# Altium footprint library ICs And Semiconductors THD.PcbLib: 292 footprints (part 11 of 19)
Each footprint in its own frame and in the unit in brackets; x right, y up, seen from the top. Pads: shape width x height; smd on the part's side, far side on the other; paste and mask are expansions set on the pad; w line width, h text height; cw(c..) or ccw(c..) is an arc to the next point about the centre after c.
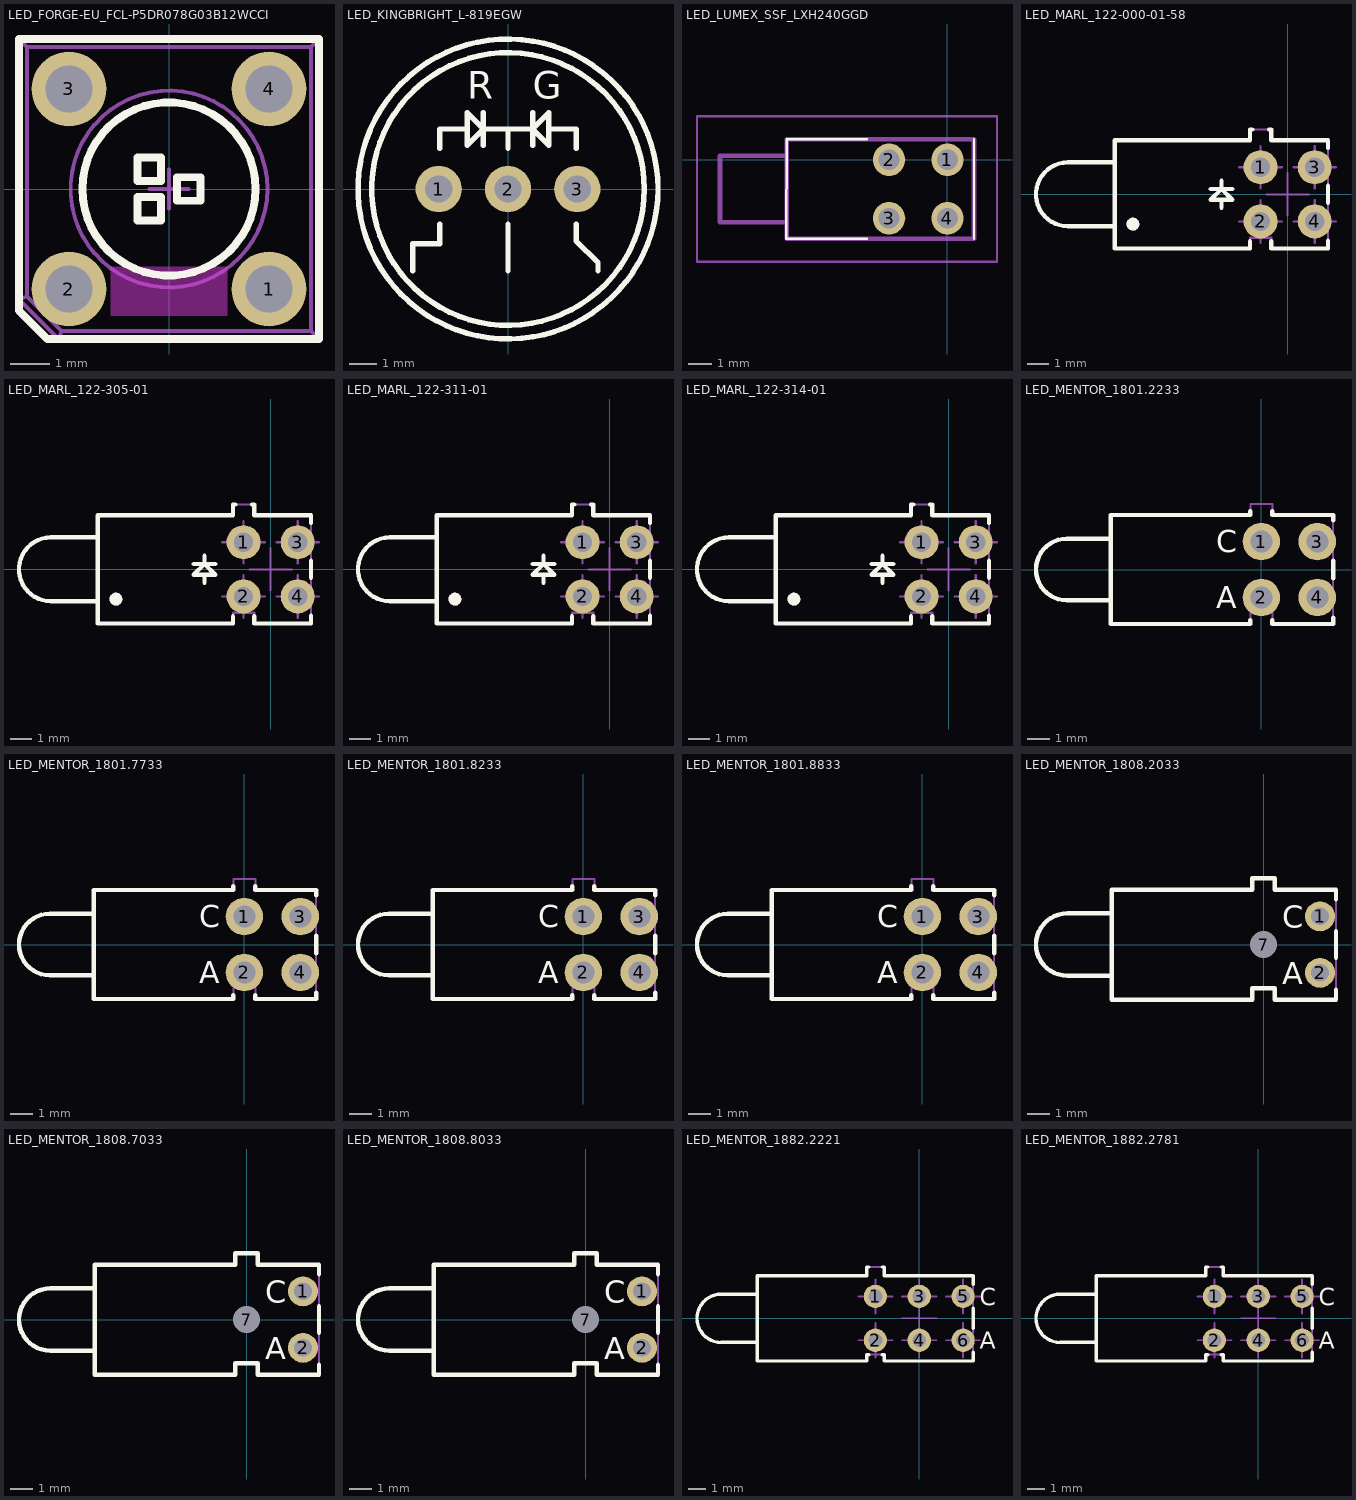
[diagram p10: the footprints below, top view; thin cyan lines are the x and y axes]

## LED_FORGE-EU_FCL-P5DR078G03B12WCCI [mm] "7.6mm Square Domed Tricolor (RGB) Through Hole LED Lamp"
height 7.4
pads (4):
  round 1.9 hole 1.2: 1(2.54,-2.54) 2(-2.54,-2.54) 3(-2.54,2.54) 4(2.54,2.54)
Top Layer keep-out:
  region: -1.475,-1.975 1.475,-1.975 1.475,-3.225 -1.475,-3.225
Top Overlay:
  circle w0.2: c0,0 r2.2
  lines w0.2: -3.81,-3.09 -3.81,3.81 3.81,3.81 3.81,-3.81 -3.09,-3.81 -3.81,-3.09 ; -0.8,-0.8 -0.2,-0.8 -0.2,-0.2 -0.8,-0.2 -0.8,-0.8 ; -0.8,0.2 -0.2,0.2 -0.2,0.8 -0.8,0.8 -0.8,0.2 ; 0.2,-0.3 0.8,-0.3 0.8,0.3 0.2,0.3 0.2,-0.3
Notvisible:
  lines w0.1: -3.04,-2.54 -2.54,-2.54 ; -3.04,2.54 -2.54,2.54 ; -2.54,-3.04 -2.54,-2.54 ; -2.54,-2.04 -2.54,-2.54 ; -2.54,2.04 -2.54,2.54 ; -2.54,3.04 -2.54,2.54 ; -2.04,-2.54 -2.54,-2.54 ; -2.04,2.54 -2.54,2.54 ; -0.5,0 0,0 ; 0,-0.5 0,0 ; 0,0.5 0,0 ; 0.5,0 0,0 ; 2.04,-2.54 2.54,-2.54 ; 2.04,2.54 2.54,2.54 ; 2.54,-3.04 2.54,-2.54 ; 2.54,-2.04 2.54,-2.54 ; 2.54,2.04 2.54,2.54 ; 2.54,3.04 2.54,2.54 ; 3.04,-2.54 2.54,-2.54 ; 3.04,2.54 2.54,2.54
Mechanical 14:
  circle w0.1: c0,0 r2.5
  lines w0.1: -3.81,-2.81 -3.61,-2.727 ; -3.81,-2.81 -3.81,3.81 ; -3.81,-2.81 -2.81,-3.81 ; -3.81,3.81 -3.61,3.61 ; -3.81,3.81 3.81,3.81 ; -3.61,-2.727 -3.61,3.61 ; -3.61,-2.727 -2.727,-3.61 ; -3.61,3.61 3.61,3.61 ; -2.81,-3.81 -2.727,-3.61 ; -2.81,-3.81 3.81,-3.81 ; -2.727,-3.61 3.61,-3.61 ; 3.61,-3.61 3.81,-3.81 ; 3.61,-3.61 3.61,3.61 ; 3.61,3.61 3.81,3.81 ; 3.81,-3.81 3.81,3.81 ; -0.8,-0.8 -0.2,-0.8 -0.2,-0.2 -0.8,-0.2 -0.8,-0.8 ; -0.8,0.2 -0.2,0.2 -0.2,0.8 -0.8,0.8 -0.8,0.2 ; 0.2,-0.3 0.8,-0.3 0.8,0.3 0.2,0.3 0.2,-0.3
3D body "LED_FORGE-EU_FCL-P5DR078G03B12WCCI.stp": height 7.4, standoff -3.6, extent -3.81,-3.81 3.81,3.81

## LED_KINGBRIGHT_L-819EGW [mm] "10mm Diameter, Bicolor Red/Green LED Lamp"
height 18.2
pads (3):
  round 1.7 hole 1: 1(-2.54,0) 2(0,0) 3(2.54,0)
Top Overlay:
  circle w0.2: c0,0 r5
  circle w0.2: c0,0 r5.5
  lines w0.2: -3.5,-3 -3.5,-2 -2.5,-2 -2.5,-1.3 ; -2.5,1.5 -2.5,2.2 -1.5,2.2 ; -0.9,1.6 -0.9,2.8 ; 0,-3 0,-1.3 ; 0,1.5 0,2.2 ; 0.9,1.6 0.9,2.8 ; 1.5,2.2 2.5,2.2 2.5,1.5 ; 2.5,-1.9 3.3,-2.7 3.3,-3 ; 2.5,-1.85 2.5,-1.3 ; -0.9,2.2 0,2.2 ; -0.9,2.2 -1.5,1.6 -1.5,2.8 -0.9,2.2 ; 0,2.2 0.9,2.2 ; 0.9,2.2 1.5,1.6 1.5,2.8 0.9,2.2
  text "G" at 0.9,3.3 h1
  text "R" at -1.5,3.3 h1
Mechanical 14:
  circle w0.1: c0,0 r5.5
  circle w0.1: c0,0 r5
  lines w0.1: -3.5,-3 -3.5,-2 -2.5,-2 -2.5,-1.3 ; -2.5,1.5 -2.5,2.2 -1.5,2.2 ; -0.9,1.6 -0.9,2.8 ; 0,-3 0,-1.3 ; 0,1.5 0,2.2 ; 0.9,1.6 0.9,2.8 ; 1.5,2.2 2.5,2.2 2.5,1.5 ; 2.5,-1.9 3.3,-2.7 3.3,-3 ; 2.5,-1.85 2.5,-1.3 ; -0.9,2.2 0,2.2 ; -0.9,2.2 -1.5,2.8 -1.5,1.6 -0.9,2.2 ; 0,2.2 0.9,2.2 ; 0.9,2.2 1.5,2.8 1.5,1.6 0.9,2.2
  text "R" at -1.5,3.3 h1
  text "G" at 0.9,3.3 h1
3D body "LED_KINGBRIGHT_L-819EGW.stp": height 18.2, standoff -3.8, extent -5.5,-5.5 5.5,5.5

## LED_LUMEX_SSF_LXH240GGD [mm]
pads (4):
  round 1.411 hole 0.91: 1(0,0) 2(-2.54,0) 3(-2.54,-2.54) 4(0,-2.54)
Top Overlay:
  lines w0.1: -3.5,-3.43 -7,-3.43 -6.98,0.89 -3.5,0.89 ; 1.15,-3.43 1.15,0.89
Mechanical 15:
  lines w0.2: -9.88,-2.72 -6.98,-2.72 -6.98,0.18 -9.88,0.18 -9.88,-2.72 ; -6.98,-3.43 -6.98,0.89 1.15,0.89 1.15,-3.43 -6.98,-3.43
Mechanical 20:
  lines w0.1: -10.88,-4.43 -10.88,1.89 2.15,1.89 2.15,-4.43 -10.88,-4.43
3D body "SSF-LXH240YGD.stp": height 9.75, standoff -5, extent -9.88,-3.43 1.15,0.89

## LED_MARL_122-000-01-58 [mm] "2x 3mm LED (Top: Red, Bot: Green) Body 10x5.08mm, Pin spacing 2.54mm"
height 10.16
pads (4):
  round 1.6 hole 0.9: 1(-1.27,1.27) 2(-1.27,-1.27) 3(1.27,1.27) 4(1.27,-1.27)
Top Overlay:
  circle w0.3: c-7.262,-1.397 r0.15
  lines w0.2: -8.11,-1.5 -10.31,-1.5 cw(c-10.31,0) -10.31,1.5 -8.11,1.5 ; -3.614,0.254 -2.598,0.254 ; -3.106,-0.635 -3.106,-0.254 ; -3.106,0.635 -3.106,0.254 ; -1.77,-2.2 -1.77,-2.54 -8.11,-2.54 -8.11,2.54 -1.77,2.54 -1.77,3.04 -1.66,3.04 ; -0.88,3.04 -0.77,3.04 -0.77,2.54 1.89,2.54 1.89,2.175 ; -0.77,-2.2 -0.77,-2.54 1.89,-2.54 1.89,-2.175 ; 1.89,-0.4 1.89,0.4 ; -3.106,0.254 -3.614,-0.254 -2.598,-0.254 -3.106,0.254
Notvisible:
  lines w0.1: -2.27,-1.27 -1.27,-1.27 ; -2.27,1.27 -1.27,1.27 ; -1.27,-2.27 -1.27,-1.27 ; -1.27,-0.27 -1.27,-1.27 ; -1.27,0.27 -1.27,1.27 ; -1.27,2.27 -1.27,1.27 ; -1,0 0,0 ; -0.27,-1.27 -1.27,-1.27 ; -0.27,1.27 -1.27,1.27 ; 0,-1 0,0 ; 0,1 0,0 ; 0.27,-1.27 1.27,-1.27 ; 0.27,1.27 1.27,1.27 ; 1,0 0,0 ; 1.27,-2.27 1.27,-1.27 ; 1.27,-0.27 1.27,-1.27 ; 1.27,0.27 1.27,1.27 ; 1.27,2.27 1.27,1.27 ; 2.27,-1.27 1.27,-1.27 ; 2.27,1.27 1.27,1.27
Mechanical 14:
  circle w0.3: c-7.262,-1.397 r0.15
  lines w0.1: -8.11,-1.5 -10.31,-1.5 cw(c-10.31,0) -10.31,1.5 -8.11,1.5 ; -3.106,-0.635 -3.106,-0.254 ; -3.106,0.635 -3.106,0.254 ; -3.614,-0.254 -2.598,-0.254 ; -3.614,-0.254 -3.106,0.254 ; -3.614,-0.254 -3.106,0.254 ; -3.614,-0.254 -2.598,-0.254 ; -3.614,-0.254 -2.598,-0.254 ; -3.614,-0.254 -3.106,0.254 ; -3.614,0.254 -2.598,0.254 ; -3.614,0.254 -2.598,0.254 ; -3.614,0.254 -2.598,0.254 ; -3.106,0.254 -2.598,-0.254 ; -3.106,0.254 -2.598,-0.254 ; -3.106,0.254 -2.598,-0.254 ; -8.11,-2.54 -8.11,2.54 -1.77,2.54 -1.77,3.04 -0.77,3.04 -0.77,2.54 1.89,2.54 1.89,-2.54 -0.77,-2.54 -0.77,-2.04 -1.77,-2.04 -1.77,-2.54 -8.11,-2.54
3D body "LED_MARL_122-000-01-58.stp": height 10.16, standoff -3.75, extent -11.81,-2.54 1.89,3.04

## LED_MARL_122-305-01 [mm] "Dual 3mm Red LED, Body 10x5.08mm, Pin spacing 2.54mm"
height 10.16
pads (4):
  round 1.6 hole 0.9: 1(-1.27,1.27) 2(-1.27,-1.27) 3(1.27,1.27) 4(1.27,-1.27)
Top Overlay:
  circle w0.3: c-7.262,-1.397 r0.15
  lines w0.2: -8.11,-1.5 -10.31,-1.5 cw(c-10.31,0) -10.31,1.5 -8.11,1.5 ; -3.614,0.254 -2.598,0.254 ; -3.106,-0.635 -3.106,-0.254 ; -3.106,0.635 -3.106,0.254 ; -1.77,-2.2 -1.77,-2.54 -8.11,-2.54 -8.11,2.54 -1.77,2.54 -1.77,3.04 -1.66,3.04 ; -0.88,3.04 -0.77,3.04 -0.77,2.54 1.89,2.54 1.89,2.175 ; -0.77,-2.2 -0.77,-2.54 1.89,-2.54 1.89,-2.175 ; 1.89,-0.4 1.89,0.4 ; -3.106,0.254 -3.614,-0.254 -2.598,-0.254 -3.106,0.254
Notvisible:
  lines w0.1: -2.27,-1.27 -1.27,-1.27 ; -2.27,1.27 -1.27,1.27 ; -1.27,-2.27 -1.27,-1.27 ; -1.27,-0.27 -1.27,-1.27 ; -1.27,0.27 -1.27,1.27 ; -1.27,2.27 -1.27,1.27 ; -1,0 0,0 ; -0.27,-1.27 -1.27,-1.27 ; -0.27,1.27 -1.27,1.27 ; 0,-1 0,0 ; 0,1 0,0 ; 0.27,-1.27 1.27,-1.27 ; 0.27,1.27 1.27,1.27 ; 1,0 0,0 ; 1.27,-2.27 1.27,-1.27 ; 1.27,-0.27 1.27,-1.27 ; 1.27,0.27 1.27,1.27 ; 1.27,2.27 1.27,1.27 ; 2.27,-1.27 1.27,-1.27 ; 2.27,1.27 1.27,1.27
Mechanical 14:
  circle w0.3: c-7.262,-1.397 r0.15
  lines w0.1: -8.11,-1.5 -10.31,-1.5 cw(c-10.31,0) -10.31,1.5 -8.11,1.5 ; -3.106,-0.635 -3.106,-0.254 ; -3.106,0.635 -3.106,0.254 ; -3.614,-0.254 -2.598,-0.254 ; -3.614,-0.254 -3.106,0.254 ; -3.614,-0.254 -3.106,0.254 ; -3.614,-0.254 -2.598,-0.254 ; -3.614,-0.254 -2.598,-0.254 ; -3.614,-0.254 -3.106,0.254 ; -3.614,0.254 -2.598,0.254 ; -3.614,0.254 -2.598,0.254 ; -3.614,0.254 -2.598,0.254 ; -3.106,0.254 -2.598,-0.254 ; -3.106,0.254 -2.598,-0.254 ; -3.106,0.254 -2.598,-0.254 ; -8.11,-2.54 -1.77,-2.54 -1.77,-2.04 -0.77,-2.04 -0.77,-2.54 1.89,-2.54 1.89,2.54 -0.77,2.54 -0.77,3.04 -1.77,3.04 -1.77,2.54 -8.11,2.54 -8.11,-2.54
3D body "LED_MARL_122-305-01.stp": height 10.16, standoff -3.75, extent -11.81,-2.54 1.89,3.04

## LED_MARL_122-311-01 [mm] "Dual 3mm Yellow LED, Body 10x5.08mm, Pin spacing 2.54mm"
height 10.16
pads (4):
  round 1.6 hole 0.9: 1(-1.27,1.27) 2(-1.27,-1.27) 3(1.27,1.27) 4(1.27,-1.27)
Top Overlay:
  circle w0.3: c-7.262,-1.397 r0.15
  lines w0.2: -8.11,-1.5 -10.31,-1.5 cw(c-10.31,0) -10.31,1.5 -8.11,1.5 ; -3.614,0.254 -2.598,0.254 ; -3.106,-0.635 -3.106,-0.254 ; -3.106,0.635 -3.106,0.254 ; -1.77,-2.2 -1.77,-2.54 -8.11,-2.54 -8.11,2.54 -1.77,2.54 -1.77,3.04 -1.66,3.04 ; -0.88,3.04 -0.77,3.04 -0.77,2.54 1.89,2.54 1.89,2.175 ; -0.77,-2.2 -0.77,-2.54 1.89,-2.54 1.89,-2.175 ; 1.89,-0.4 1.89,0.4 ; -3.106,0.254 -3.614,-0.254 -2.598,-0.254 -3.106,0.254
Notvisible:
  lines w0.1: -2.27,-1.27 -1.27,-1.27 ; -2.27,1.27 -1.27,1.27 ; -1.27,-2.27 -1.27,-1.27 ; -1.27,-0.27 -1.27,-1.27 ; -1.27,0.27 -1.27,1.27 ; -1.27,2.27 -1.27,1.27 ; -1,0 0,0 ; -0.27,-1.27 -1.27,-1.27 ; -0.27,1.27 -1.27,1.27 ; 0,-1 0,0 ; 0,1 0,0 ; 0.27,-1.27 1.27,-1.27 ; 0.27,1.27 1.27,1.27 ; 1,0 0,0 ; 1.27,-2.27 1.27,-1.27 ; 1.27,-0.27 1.27,-1.27 ; 1.27,0.27 1.27,1.27 ; 1.27,2.27 1.27,1.27 ; 2.27,-1.27 1.27,-1.27 ; 2.27,1.27 1.27,1.27
Mechanical 14:
  circle w0.3: c-7.262,-1.397 r0.15
  lines w0.1: -8.11,-1.5 -10.31,-1.5 cw(c-10.31,0) -10.31,1.5 -8.11,1.5 ; -3.106,-0.635 -3.106,-0.254 ; -3.106,0.635 -3.106,0.254 ; -3.614,-0.254 -2.598,-0.254 ; -3.614,-0.254 -3.106,0.254 ; -3.614,-0.254 -3.106,0.254 ; -3.614,-0.254 -2.598,-0.254 ; -3.614,-0.254 -2.598,-0.254 ; -3.614,-0.254 -3.106,0.254 ; -3.614,0.254 -2.598,0.254 ; -3.614,0.254 -2.598,0.254 ; -3.614,0.254 -2.598,0.254 ; -3.106,0.254 -2.598,-0.254 ; -3.106,0.254 -2.598,-0.254 ; -3.106,0.254 -2.598,-0.254 ; -8.11,-2.54 -8.11,2.54 -1.77,2.54 -1.77,3.04 -0.77,3.04 -0.77,2.54 1.89,2.54 1.89,-2.54 -0.77,-2.54 -0.77,-2.04 -1.77,-2.04 -1.77,-2.54 -8.11,-2.54
3D body "LED_MARL_122-311-01.stp": height 10.16, standoff -3.75, extent -11.81,-2.54 1.89,3.04

## LED_MARL_122-314-01 [mm] "Dual 3mm Green LED, Body 10x5.08mm, Pin spacing 2.54mm"
height 10.16
pads (4):
  round 1.6 hole 0.9: 1(-1.27,1.27) 2(-1.27,-1.27) 3(1.27,1.27) 4(1.27,-1.27)
Top Overlay:
  circle w0.3: c-7.262,-1.397 r0.15
  lines w0.2: -8.11,-1.5 -10.31,-1.5 cw(c-10.31,0) -10.31,1.5 -8.11,1.5 ; -3.614,0.254 -2.598,0.254 ; -3.106,-0.635 -3.106,-0.254 ; -3.106,0.635 -3.106,0.254 ; -1.77,-2.2 -1.77,-2.54 -8.11,-2.54 -8.11,2.54 -1.77,2.54 -1.77,3.04 -1.66,3.04 ; -0.88,3.04 -0.77,3.04 -0.77,2.54 1.89,2.54 1.89,2.175 ; -0.77,-2.2 -0.77,-2.54 1.89,-2.54 1.89,-2.175 ; 1.89,-0.4 1.89,0.4 ; -3.106,0.254 -2.598,-0.254 -3.614,-0.254 -3.106,0.254
Notvisible:
  lines w0.1: -2.27,-1.27 -1.27,-1.27 ; -2.27,1.27 -1.27,1.27 ; -1.27,-2.27 -1.27,-1.27 ; -1.27,-0.27 -1.27,-1.27 ; -1.27,0.27 -1.27,1.27 ; -1.27,2.27 -1.27,1.27 ; -1,0 0,0 ; -0.27,-1.27 -1.27,-1.27 ; -0.27,1.27 -1.27,1.27 ; 0,-1 0,0 ; 0,1 0,0 ; 0.27,-1.27 1.27,-1.27 ; 0.27,1.27 1.27,1.27 ; 1,0 0,0 ; 1.27,-2.27 1.27,-1.27 ; 1.27,-0.27 1.27,-1.27 ; 1.27,0.27 1.27,1.27 ; 1.27,2.27 1.27,1.27 ; 2.27,-1.27 1.27,-1.27 ; 2.27,1.27 1.27,1.27
Mechanical 14:
  circle w0.3: c-7.262,-1.397 r0.15
  lines w0.1: -8.11,-1.5 -10.31,-1.5 cw(c-10.31,0) -10.31,1.5 -8.11,1.5 ; -3.106,-0.635 -3.106,-0.254 ; -3.106,0.635 -3.106,0.254 ; -3.614,-0.254 -3.106,0.254 ; -3.614,-0.254 -2.598,-0.254 ; -3.614,-0.254 -2.598,-0.254 ; -3.614,-0.254 -3.106,0.254 ; -3.614,-0.254 -3.106,0.254 ; -3.614,-0.254 -2.598,-0.254 ; -3.614,0.254 -2.598,0.254 ; -3.614,0.254 -2.598,0.254 ; -3.614,0.254 -2.598,0.254 ; -3.106,0.254 -2.598,-0.254 ; -3.106,0.254 -2.598,-0.254 ; -3.106,0.254 -2.598,-0.254 ; -8.11,-2.54 -8.11,2.54 -1.77,2.54 -1.77,3.04 -0.77,3.04 -0.77,2.54 1.89,2.54 1.89,-2.54 -0.77,-2.54 -0.77,-2.04 -1.77,-2.04 -1.77,-2.54 -8.11,-2.54
3D body "LED_MARL_122-314-01.stp": height 10.16, standoff -3.75, extent -11.81,-2.54 1.89,3.04

## LED_MENTOR_1801.2233 [mm] "2 x LED 3mm  (Top: HEF Red, Bot: HEF Red) PCB Edge Mounting MENTOR 1801.2233"
height 10
pads (4):
  round 1.7 hole 1: 1(0,1.27) 2(0,-1.27) 3(2.54,1.27) 4(2.54,-1.27)
Top Overlay:
  lines w0.2: -6.84,-1.4 -8.84,-1.4 cw(c-8.84,0) -8.84,1.4 -6.84,1.4 ; -0.5,-2.3 -0.5,-2.475 -6.84,-2.475 -6.84,2.475 -0.5,2.475 -0.5,2.65 ; 0.5,-2.3 0.5,-2.475 3.26,-2.475 3.26,-2.2 ; 0.5,2.65 0.5,2.475 3.26,2.475 3.26,2.24 ; 3.26,-0.4 3.26,0.4
  text "A" at -2.062,-1.753 h1
  text "C" at -2.062,0.787 h1
Mechanical 14:
  lines w0.1: -6.84,-1.4 -8.84,-1.4 cw(c-8.84,0) -8.84,1.4 -6.84,1.4 ; -6.84,-2.475 -6.84,2.475 -0.5,2.475 -0.5,2.975 0.5,2.975 0.5,2.475 3.26,2.475 3.26,-2.475 0.5,-2.475 0.5,-1.975 -0.5,-1.975 -0.5,-2.475 -6.84,-2.475
  text "C" at -2.062,0.787 h1
  text "A" at -2.062,-1.753 h1
3D body "LED_MENTOR_1801.2233.stp": height 10, standoff -3.2, extent -10.24,-2.475 3.246,2.975

## LED_MENTOR_1801.7733 [mm] "2 x LED 3mm  (Top: Yellow, Bot: Yellow) PCB Edge Mounting MENTOR 1801.7733"
height 10
pads (4):
  round 1.7 hole 1: 1(0,1.27) 2(0,-1.27) 3(2.54,1.27) 4(2.54,-1.27)
Top Overlay:
  lines w0.2: -6.84,-1.4 -8.84,-1.4 cw(c-8.84,0) -8.84,1.4 -6.84,1.4 ; -0.5,-2.3 -0.5,-2.475 -6.84,-2.475 -6.84,2.475 -0.5,2.475 -0.5,2.65 ; 0.5,-2.3 0.5,-2.475 3.26,-2.475 3.26,-2.2 ; 0.5,2.65 0.5,2.475 3.26,2.475 3.26,2.24 ; 3.26,-0.4 3.26,0.4
  text "C" at -2.062,0.787 h1
  text "A" at -2.062,-1.753 h1
Mechanical 14:
  lines w0.1: -6.84,-1.4 -8.84,-1.4 cw(c-8.84,0) -8.84,1.4 -6.84,1.4 ; -6.84,-2.475 -0.5,-2.475 -0.5,-1.975 0.5,-1.975 0.5,-2.475 3.26,-2.475 3.26,2.475 0.5,2.475 0.5,2.975 -0.5,2.975 -0.5,2.475 -6.84,2.475 -6.84,-2.475
  text "A" at -2.062,-1.753 h1
  text "C" at -2.062,0.787 h1
3D body "LED_MENTOR_1801.7733.stp": height 10, standoff -3.2, extent -10.225,-2.475 3.26,2.975

## LED_MENTOR_1801.8233 [mm] "2 x LED 3mm  (Top: Red, Bot: Green) PCB Edge Mounting MENTOR 1801.8233"
height 10
pads (4):
  round 1.7 hole 1: 1(0,1.27) 2(0,-1.27) 3(2.54,1.27) 4(2.54,-1.27)
Top Overlay:
  lines w0.2: -6.84,-1.4 -8.84,-1.4 cw(c-8.84,0) -8.84,1.4 -6.84,1.4 ; -0.5,-2.3 -0.5,-2.475 -6.84,-2.475 -6.84,2.475 -0.5,2.475 -0.5,2.65 ; 0.5,-2.3 0.5,-2.475 3.26,-2.475 3.26,-2.2 ; 0.5,2.65 0.5,2.475 3.26,2.475 3.26,2.24 ; 3.26,-0.4 3.26,0.4
  text "C" at -2.062,0.787 h1
  text "A" at -2.062,-1.753 h1
Mechanical 14:
  lines w0.1: -6.84,-1.4 -8.84,-1.4 cw(c-8.84,0) -8.84,1.4 -6.84,1.4 ; -6.84,-2.475 -0.5,-2.475 -0.5,-1.975 0.5,-1.975 0.5,-2.475 3.26,-2.475 3.26,2.475 0.5,2.475 0.5,2.975 -0.5,2.975 -0.5,2.475 -6.84,2.475 -6.84,-2.475
  text "A" at -2.062,-1.753 h1
  text "C" at -2.062,0.787 h1
3D body "LED_MENTOR_1801.8233 (2).stp": height 10, standoff -3.2, extent -10.24,-2.475 3.245,2.975

## LED_MENTOR_1801.8833 [mm] "2 x LED 3mm  (Top: Green, Bot: Green) PCB Edge Mounting MENTOR 1801.8833"
height 10
pads (4):
  round 1.7 hole 1: 1(0,1.27) 2(0,-1.27) 3(2.54,1.27) 4(2.54,-1.27)
Top Overlay:
  lines w0.2: -6.84,-1.4 -8.84,-1.4 cw(c-8.84,0) -8.84,1.4 -6.84,1.4 ; -0.5,-2.3 -0.5,-2.475 -6.84,-2.475 -6.84,2.475 -0.5,2.475 -0.5,2.65 ; 0.5,-2.3 0.5,-2.475 3.26,-2.475 3.26,-2.2 ; 0.5,2.65 0.5,2.475 3.26,2.475 3.26,2.24 ; 3.26,-0.4 3.26,0.4
  text "A" at -2.062,-1.753 h1
  text "C" at -2.062,0.787 h1
Mechanical 14:
  lines w0.1: -6.84,-1.4 -8.84,-1.4 cw(c-8.84,0) -8.84,1.4 -6.84,1.4 ; -6.84,-2.475 -6.84,2.475 -0.5,2.475 -0.5,2.975 0.5,2.975 0.5,2.475 3.26,2.475 3.26,-2.475 0.5,-2.475 0.5,-1.975 -0.5,-1.975 -0.5,-2.475 -6.84,-2.475
  text "C" at -2.062,0.787 h1
  text "A" at -2.062,-1.753 h1
3D body "LED_MENTOR_1801.8833.stp": height 10, standoff -3.2, extent -10.225,-2.475 3.26,2.975

## LED_MENTOR_1808.2033 [mm] "Red LED 3mm PCB Edge Mounting MENTOR 1808.2033"
height 10
pads (3):
  round 1.35 hole 0.8: 1(2.54,1.27) 2(2.54,-1.27)
  round 1 hole 1.2 unplated: 7(0,0)
Top Overlay:
  lines w0.2: -6.84,-1.4 -8.84,-1.4 cw(c-8.84,0) -8.84,1.4 -6.84,1.4 ; 3.26,-2.04 3.26,-2.475 0.5,-2.475 0.5,-1.975 -0.5,-1.975 -0.5,-2.475 -6.84,-2.475 -6.84,2.475 -0.5,2.475 -0.5,2.975 0.5,2.975 0.5,2.475 3.26,2.475 3.26,2.04 ; 3.26,-0.6 3.26,0.6
  text "A" at 0.838,-1.778 h1
  text "C" at 0.838,0.762 h1
Mechanical 14:
  lines w0.1: -6.84,-1.4 -8.84,-1.4 cw(c-8.84,0) -8.84,1.4 -6.84,1.4 ; -6.84,-2.475 -6.84,2.475 -0.5,2.475 -0.5,2.975 0.5,2.975 0.5,2.475 3.26,2.475 3.26,-2.475 0.5,-2.475 0.5,-1.975 -0.5,-1.975 -0.5,-2.475 -6.84,-2.475
  text "C" at 0.838,0.762 h1
  text "A" at 0.838,-1.778 h1
3D body "LED_MENTOR_1808.2033.stp": height 10, standoff -3.2, extent -10.24,-2.475 3.245,2.975

## LED_MENTOR_1808.7033 [mm] "Yellow LED 3mm PCB Edge Mounting MENTOR 1808.2033"
height 10
pads (3):
  round 1.35 hole 0.8: 1(2.54,1.27) 2(2.54,-1.27)
  round 1 hole 1.2 unplated: 7(0,0)
Top Overlay:
  lines w0.2: -6.84,-1.4 -8.84,-1.4 cw(c-8.84,0) -8.84,1.4 -6.84,1.4 ; 3.26,-2.04 3.26,-2.475 0.5,-2.475 0.5,-1.975 -0.5,-1.975 -0.5,-2.475 -6.84,-2.475 -6.84,2.475 -0.5,2.475 -0.5,2.975 0.5,2.975 0.5,2.475 3.26,2.475 3.26,2.04 ; 3.26,-0.6 3.26,0.6
  text "C" at 0.838,0.762 h1
  text "A" at 0.838,-1.778 h1
Mechanical 14:
  lines w0.1: -6.84,-1.4 -8.84,-1.4 cw(c-8.84,0) -8.84,1.4 -6.84,1.4 ; -6.84,-2.475 -0.5,-2.475 -0.5,-1.975 0.5,-1.975 0.5,-2.475 3.26,-2.475 3.26,2.475 0.5,2.475 0.5,2.975 -0.5,2.975 -0.5,2.475 -6.84,2.475 -6.84,-2.475
  text "C" at 0.838,0.762 h1
  text "A" at 0.838,-1.778 h1
3D body "LED_MENTOR_1808.7033.stp": height 10, standoff -3.2, extent -10.24,-2.475 3.26,2.975

## LED_MENTOR_1808.8033 [mm] "Green LED 3mm PCB Edge Mounting MENTOR 1808.8033"
height 10
pads (3):
  round 1.35 hole 0.8: 1(2.54,1.27) 2(2.54,-1.27)
  round 1 hole 1.2 unplated: 7(0,0)
Top Overlay:
  lines w0.2: -6.84,-1.4 -8.84,-1.4 cw(c-8.84,0) -8.84,1.4 -6.84,1.4 ; 3.26,-2.04 3.26,-2.475 0.5,-2.475 0.5,-1.975 -0.5,-1.975 -0.5,-2.475 -6.84,-2.475 -6.84,2.475 -0.5,2.475 -0.5,2.975 0.5,2.975 0.5,2.475 3.26,2.475 3.26,2.04 ; 3.26,-0.6 3.26,0.6
  text "A" at 0.838,-1.778 h1
  text "C" at 0.838,0.762 h1
Mechanical 14:
  lines w0.1: -6.84,-1.4 -8.84,-1.4 cw(c-8.84,0) -8.84,1.4 -6.84,1.4 ; -6.84,-2.475 -6.84,2.475 -0.5,2.475 -0.5,2.975 0.5,2.975 0.5,2.475 3.26,2.475 3.26,-2.475 0.5,-2.475 0.5,-1.975 -0.5,-1.975 -0.5,-2.475 -6.84,-2.475
  text "A" at 0.838,-1.778 h1
  text "C" at 0.838,0.762 h1
3D body "LED_MENTOR_1808.8033.stp": height 10, standoff -3.2, extent -10.24,-2.475 3.245,2.975

## LED_MENTOR_1882.2221 [mm] "3x Red LED 3mm PCB Edge Mounting MENTOR 1882.2221"
height 12
pads (6):
  round 1.35 hole 0.8: 1(-2.54,1.27) 2(-2.54,-1.27) 3(0,1.27) 4(0,-1.27) 5(2.54,1.27) 6(2.54,-1.27)
Top Overlay:
  lines w0.2: -9.38,-1.4 -11.48,-1.4 cw(c-11.48,0) -11.48,1.4 -9.38,1.4 ; -2.93,-2.1 -3.04,-2.1 -3.04,-2.475 -9.38,-2.475 -9.38,2.475 -3.04,2.475 -3.04,2.975 -2.93,2.975 ; -2.15,-2.1 -2.04,-2.1 -2.04,-2.475 3.12,-2.475 3.12,-1.958 ; -2.15,2.975 -2.04,2.975 -2.04,2.475 3.12,2.475 3.12,1.958 ; 3.12,-0.582 3.12,0.582
  text "C" at 3.505,0.762 h1
  text "A" at 3.505,-1.778 h1
Notvisible:
  lines w0.1: -3.54,-1.27 -2.54,-1.27 ; -3.54,1.27 -2.54,1.27 ; -2.54,-2.27 -2.54,-1.27 ; -2.54,-0.27 -2.54,-1.27 ; -2.54,0.27 -2.54,1.27 ; -2.54,2.27 -2.54,1.27 ; -1.54,-1.27 -2.54,-1.27 ; -1.54,1.27 -2.54,1.27 ; -1,-1.27 0,-1.27 ; -1,0 0,0 ; -1,1.27 0,1.27 ; 0,-2.27 0,-1.27 ; 0,-1 0,0 ; 0,1 0,0 ; 0,2.27 0,1.27 ; 1,-1.27 0,-1.27 ; 1,0 0,0 ; 1,1.27 0,1.27 ; 1.54,-1.27 2.54,-1.27 ; 1.54,1.27 2.54,1.27 ; 2.54,-2.27 2.54,-1.27 ; 2.54,-0.27 2.54,-1.27 ; 2.54,0.27 2.54,1.27 ; 2.54,2.27 2.54,1.27 ; 3.54,-1.27 2.54,-1.27 ; 3.54,1.27 2.54,1.27
Mechanical 14:
  lines w0.1: -9.38,-1.4 -11.48,-1.4 cw(c-11.48,0) -11.48,1.4 -9.38,1.4 ; -9.38,-2.475 -9.38,2.475 -3.04,2.475 -3.04,2.975 -2.04,2.975 -2.04,2.475 3.12,2.475 3.12,-2.475 -2.04,-2.475 -2.04,-2.1 -3.04,-2.1 -3.04,-2.475 -9.38,-2.475
  text "C" at 3.505,0.762 h1
  text "A" at 3.505,-1.778 h1
3D body "LED_MENTOR_1882.2221.stp": height 12, standoff -3.2, extent -12.88,-2.475 3.12,2.975

## LED_MENTOR_1882.2781 [mm] "3x LED 3mm (Red+Yellow +Green) PCB Edge Mounting MENTOR 1882.2781"
height 12
pads (6):
  round 1.35 hole 0.8: 1(-2.54,1.27) 2(-2.54,-1.27) 3(0,1.27) 4(0,-1.27) 5(2.54,1.27) 6(2.54,-1.27)
Top Overlay:
  lines w0.2: -9.38,-1.4 -11.48,-1.4 cw(c-11.48,0) -11.48,1.4 -9.38,1.4 ; -2.93,-2.1 -3.04,-2.1 -3.04,-2.475 -9.38,-2.475 -9.38,2.475 -3.04,2.475 -3.04,2.975 -2.93,2.975 ; -2.15,-2.1 -2.04,-2.1 -2.04,-2.475 3.12,-2.475 3.12,-1.958 ; -2.15,2.975 -2.04,2.975 -2.04,2.475 3.12,2.475 3.12,1.958 ; 3.12,-0.582 3.12,0.582
  text "C" at 3.505,0.762 h1
  text "A" at 3.505,-1.778 h1
Notvisible:
  lines w0.1: -3.54,-1.27 -2.54,-1.27 ; -3.54,1.27 -2.54,1.27 ; -2.54,-2.27 -2.54,-1.27 ; -2.54,-0.27 -2.54,-1.27 ; -2.54,0.27 -2.54,1.27 ; -2.54,2.27 -2.54,1.27 ; -1.54,-1.27 -2.54,-1.27 ; -1.54,1.27 -2.54,1.27 ; -1,-1.27 0,-1.27 ; -1,0 0,0 ; -1,1.27 0,1.27 ; 0,-2.27 0,-1.27 ; 0,-1 0,0 ; 0,1 0,0 ; 0,2.27 0,1.27 ; 1,-1.27 0,-1.27 ; 1,0 0,0 ; 1,1.27 0,1.27 ; 1.54,-1.27 2.54,-1.27 ; 1.54,1.27 2.54,1.27 ; 2.54,-2.27 2.54,-1.27 ; 2.54,-0.27 2.54,-1.27 ; 2.54,0.27 2.54,1.27 ; 2.54,2.27 2.54,1.27 ; 3.54,-1.27 2.54,-1.27 ; 3.54,1.27 2.54,1.27
Mechanical 14:
  lines w0.1: -9.38,-1.4 -11.48,-1.4 cw(c-11.48,0) -11.48,1.4 -9.38,1.4 ; -9.38,-2.475 -9.38,2.475 -3.04,2.475 -3.04,2.975 -2.04,2.975 -2.04,2.475 3.12,2.475 3.12,-2.475 -2.04,-2.475 -2.04,-2.1 -3.04,-2.1 -3.04,-2.475 -9.38,-2.475
  text "C" at 3.505,0.762 h1
  text "A" at 3.505,-1.778 h1
3D body "LED_MENTOR_1882.2781.stp": height 12, standoff -3.2, extent -12.88,-2.475 3.12,2.975